# Altium footprint library PcbLib.PcbLib: 428 footprints (part 6 of 27)
Each footprint in its own frame and in the unit in brackets; x right, y up, seen from the top. Pads: shape width x height; smd on the part's side, far side on the other; paste and mask are expansions set on the pad; w line width, h text height; cw(c..) or ccw(c..) is an arc to the next point about the centre after c.
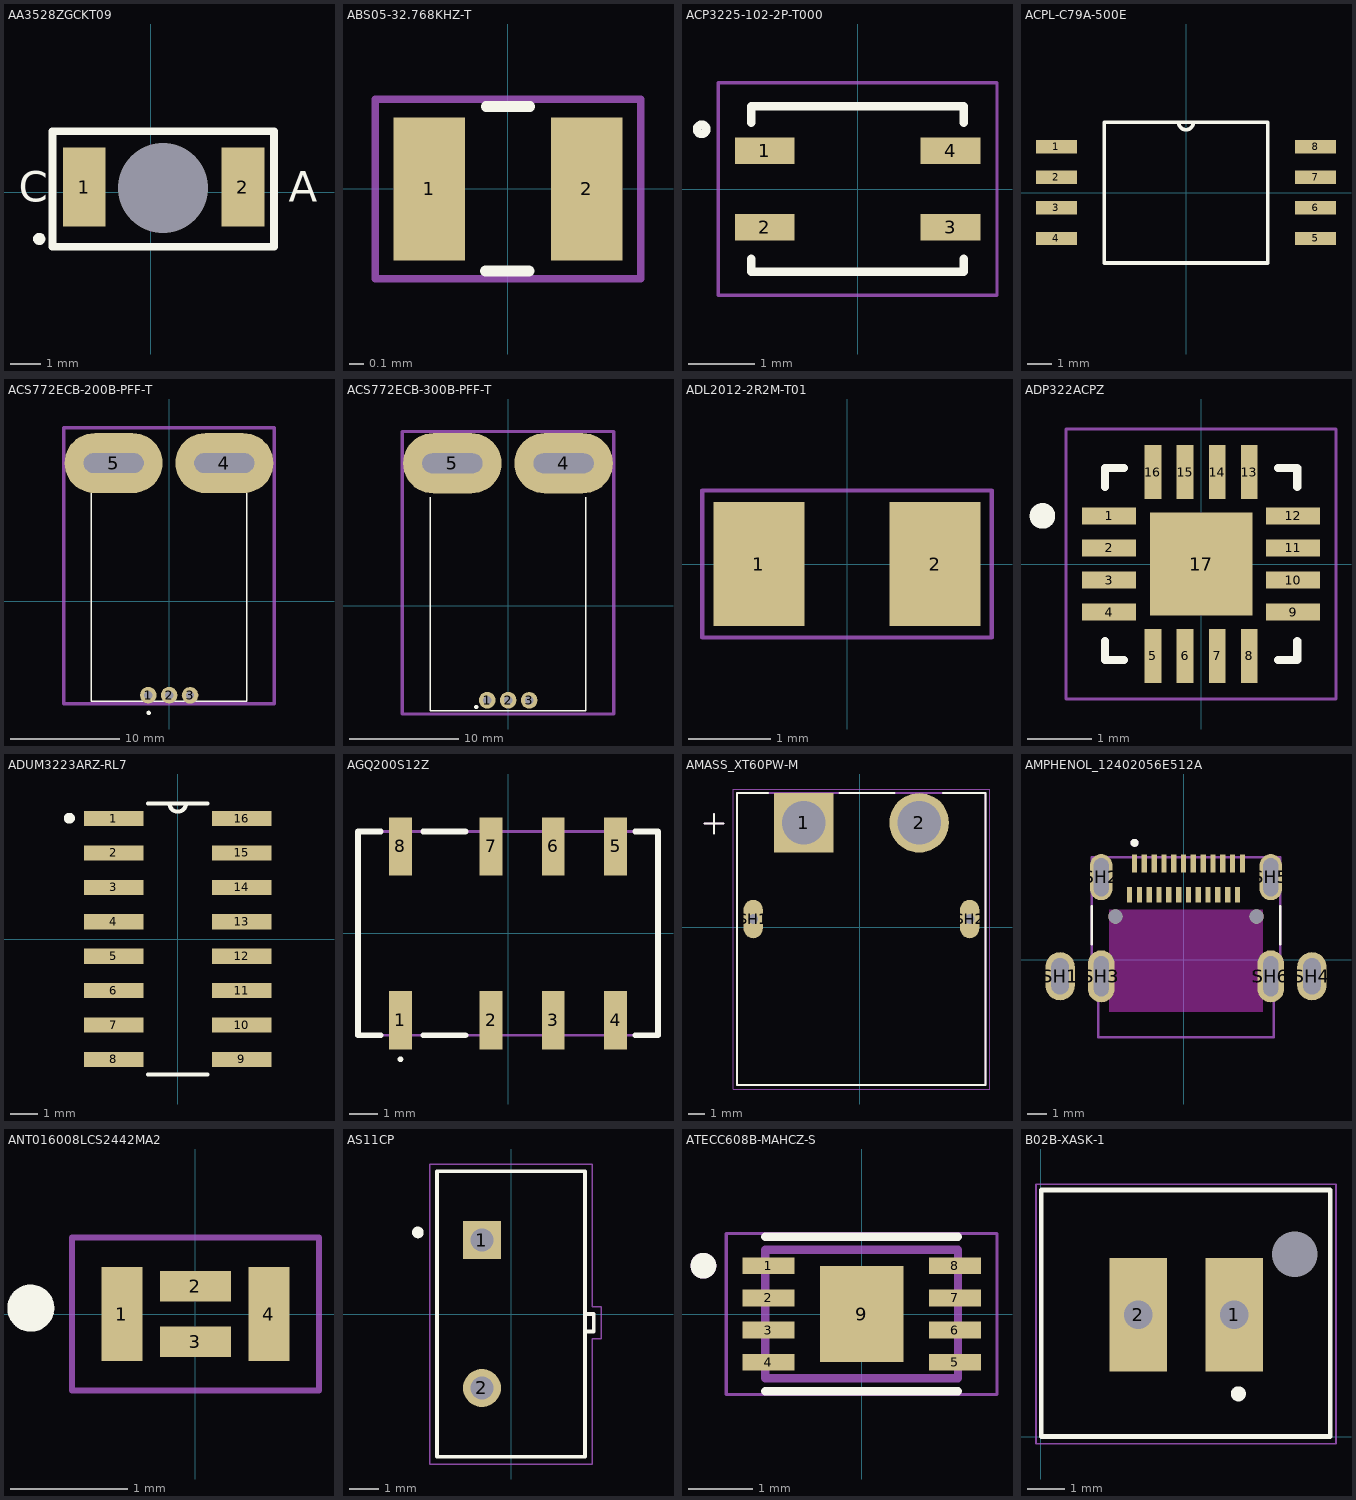
[diagram p5: the footprints below, top view; thin cyan lines are the x and y axes]

## AA3528ZGCKT09 [mil]
pads (3):
  rect 55.12x102.36 smd: 1(-86,7) 2(119,7)
  round 0 hole 116.14 unplated: 6(16,6)
Top Overlay:
  circle w7.87: c-144,-60 r3.94
  lines w10: -127,-70 159,-70 159,79 -127,79 -127,-70
  text "C" at -170.13,-12.13 h39.37
  text "A" at 177.87,-12.13 h39.37
3D body "AA3528-09.STEP": height 76.85, standoff 2.04, extent -85.72,-48.12 119,62.12
3D body: height 3.94, standoff 0, extent -35.18,-45.18 67.18,57.18

## ABS05-32.768KHZ-T [mm]
pads (2):
  rect 0.5x1 smd: 1(-0.55,0) 2(0.55,0)
Top Overlay:
  lines w0.076: -0.157,-0.574 0.147,-0.574 ; -0.152,0.577 0.152,0.577
Mechanical 15:
  lines w0.051: -0.929,-0.628 0.928,-0.628 0.928,0.627 -0.929,0.627 -0.929,-0.628
3D body "ABS05-32.768KHZ-T--3DModel-STEP-400430.STEP": height 0.5, standoff 0, extent -0.8,-0.5 0.8,0.5

## ACP3225-102-2P-T000 [mm]
pads (4):
  rect 0.9x0.4 smd: 1(-1.4,0.575) 2(-1.4,-0.575) 3(1.4,-0.575) 4(1.4,0.575)
Top Overlay:
  circle w0.127: c-2.35,0.9 r0.071
  lines w0.127: -1.6,-1.05 -1.6,-1.25 1.6,-1.25 1.6,-1.05 ; -1.6,1 -1.6,1.25 1.6,1.25 1.6,1
Mechanical 15:
  lines w0.05: -2.1,-1.6 -2.1,1.6 2.1,1.6 2.1,-1.6 -2.1,-1.6
3D body "acp3225.step": height 1.98, standoff 0.08, extent -1.6,-1.23 1.6,1.27

## ACPL-C79A-500E [mil]
pads (8):
  rect 67x22 smd: 1(-212,75) 2(-212,25) 3(-212,-25) 4(-212,-75) 5(212,-75) 6(212,-25) 7(212,25) 8(212,75)
Top Overlay:
  lines w6: -12,115 ccw(c0,115) 12,115 ; -12,115 -134,115 -134,-115 134,-115 134,115 12,115 ; -12,115 12,115
3D body "SO-8_ACPL-C79A-000E_BRA.step": height 125.12, standoff 0, extent -226.38,-115.12 226.38,114.88

## ACS772ECB-200B-PFF-T [mm]
pads (5):
  round 1.524 hole 0.762: 1(-1.9,-8.6) 2(0.01,-8.6) 3(1.932,-8.616)
  oval 9x5.5 hole 1.8 slot 5.5 at 0 deg: 4(5.08,12.7) 5(-5.08,12.7)
Top Overlay:
  circle w0.2: c-1.86,-10.23 r0.1
  lines w0.127: -7.112,9.906 -7.112,-9.144 7.112,-9.144 7.112,9.906
Mechanical 15:
  lines w0.3: -9.652,-9.398 9.652,-9.398 9.652,15.931 -9.652,15.931 -9.652,-9.398
3D body "ACS758ECB-200B-PFF-T.STEP": height 7.1, standoff -3.5, extent -7,-9.124 7,13.462

## ACS772ECB-300B-PFF-T [mm] "+- 300A"
pads (5):
  round 1.524 hole 0.762: 1(-1.9,-8.6) 2(0.01,-8.6) 3(1.932,-8.616)
  oval 9x5.5 hole 1.8 slot 5.5 at 0 deg: 4(5.08,13.02) 5(-5.08,13.02)
Top Overlay:
  circle w0.2: c-2.9,-9.22 r0.1
  lines w0.127: -7.112,9.906 -7.112,-9.57 7.112,-9.57 7.112,9.906
Mechanical 15:
  lines w0.3: -9.652,-9.86 -9.652,15.931 9.652,15.931 9.652,-9.86 -9.652,-9.86
3D body "ACS772ECB-300B-PFF-T.stp": height 7.57, standoff -2.97, extent -6.992,-8.994 7.008,13.823

## ADL2012-2R2M-T01 [mm]
pads (2):
  rect 1.1x1.5 smd: 1(-1.065,0) 2(1.065,0)
Mechanical 15:
  lines w0.05: -1.753,-0.889 1.753,-0.889 1.753,0.889 -1.753,0.889 -1.753,-0.889
3D body "IND_ADL2012_TDK.step": height 1.81, standoff 0.05, extent -1.131,-0.761 1.181,0.737

## ADP322ACPZ [mm]
pads (17):
  rect 0.84x0.26 smd: 1(-1.435,0.75) 2(-1.435,0.25) 3(-1.435,-0.25) 4(-1.435,-0.75) 9(1.435,-0.75) 10(1.435,-0.25) 11(1.435,0.25) 12(1.435,0.75)
  rect 0.26x0.84 smd: 5(-0.75,-1.435) 6(-0.25,-1.435) 7(0.25,-1.435) 8(0.75,-1.435) 13(0.75,1.435) 14(0.25,1.435) 15(-0.25,1.435) 16(-0.75,1.435)
  rect 1.6x1.6 smd paste-0.29: 17(0,0)
Top Overlay:
  circle w0.2: c-2.475,0.75 r0.1
  lines w0.127: -1.5,-1.2 -1.5,-1.5 -1.2,-1.5 ; -1.5,1.2 -1.5,1.5 -1.2,1.5 ; 1.2,-1.5 1.5,-1.5 1.5,-1.2 ; 1.2,1.5 1.5,1.5 1.5,1.2
Mechanical 15:
  lines w0.05: -2.105,-2.105 2.105,-2.105 2.105,2.105 -2.105,2.105 -2.105,-2.105
3D body "step_temp.STEP": height 0.8, standoff 0, extent -1.5,-1.5 1.5,1.5

## ADUM3223ARZ-RL7 [mil]
pads (16):
  rect 86x22 smd: 1(-93,175) 2(-93,125) 3(-93,75) 4(-93,25) 5(-93,-25) 6(-93,-75) 7(-93,-125) 8(-93,-175) 9(93,-175) 10(93,-125) 11(93,-75) 12(93,-25) 13(93,25) 14(93,75) 15(93,125) 16(93,175)
Top Overlay:
  circle w7.87: c-157.44,175.53 r3.94
  lines w6: -43,-197 43,-197 ; -43,197 -12,197 ; 43,197 12,197 ; -12,197 ccw(c0,197) 12,197 ; -12,197 12,197
3D body "ADUM3223ARZ.STEP": height 68.9, standoff 0, extent -118.11,-194.88 118.11,194.88

## AGQ200S12Z [mm]
pads (8):
  rect 0.8x2.06 smd: 1(-3.8,-3.07) 2(-0.6,-3.07) 3(1.6,-3.07) 4(3.8,-3.07) 5(3.8,3.07) 6(1.6,3.07) 7(-0.6,3.07) 8(-3.8,3.07)
Top Overlay:
  lines w0.1: -3.8,-4.5 ccw(c-3.8,-4.45) -3.8,-4.4 ccw(c-3.8,-4.45) -3.8,-4.5
  lines w0.2: -4.5,-3.6 -5.3,-3.6 -5.3,3.6 -4.5,3.6 ; -3,-3.6 -1.5,-3.6 ; -3,3.6 -1.5,3.6 ; 4.5,-3.6 5.3,-3.6 5.3,3.6 4.5,3.6
Mechanical 13:
  lines w0.1: -5.3,-3.6 -5.3,3.6 5.3,3.6 5.3,-3.6 -5.3,-3.6
3D body "AGQ200S12Z.stp": height 5.5, standoff 0, extent -5.3,-4.02 5.3,4.02

## AMASS_XT60PW-M [mm]
pads (4):
  rect 3.716x3.716 / inner round 3.716 / far side rect 3.716x3.716 hole 2.7 mask+0.102: 1(-3.498,6.508)
  round 3.716 hole 2.7 mask+0.102: 2(3.702,6.508)
  oval 1.2x2.4 hole 0.6 square mask+0.102: SH1(-6.648,0.508) SH2(6.852,0.508)
Top Overlay:
  lines w0.127: -9.698,6.458 -8.498,6.458 ; -9.098,5.858 -9.098,7.058 ; -5.726,8.358 -7.648,8.358 -7.648,-9.842 7.852,-9.842 7.852,8.358 5.18,8.358 ; -1.27,8.358 2.174,8.358
Mechanical 13:
  lines w0.127: -9.698,6.458 -8.498,6.458 ; -9.098,5.858 -9.098,7.058 ; -7.648,-9.842 7.852,-9.842 7.852,8.358 -7.648,8.358 -7.648,-9.842
Mechanical 15:
  lines w0.05: -7.898,-10.092 8.102,-10.092 8.102,8.618 -7.898,8.618 -7.898,-10.092
3D body "step_temp.STEP": height 8.4, standoff -2.55, extent -7.648,-9.842 7.852,8.358

## AMPHENOL_12402056E512A [mm]
pads (32):
  rect 0.27x0.9 smd: A1(-2.498,4.91) A2(-1.998,4.91) A3(-1.498,4.91) A4(-0.998,4.91) A5(-0.498,4.91) A6(0.002,4.91) A7(0.502,4.91) A8(1.002,4.91) A9(1.502,4.91) A10(2.002,4.91) A11(2.502,4.91) A12(3.002,4.91)
  rect 0.27x0.8 smd: B1(2.752,3.31) B2(2.252,3.31) B3(1.752,3.31) B4(1.252,3.31) B5(0.752,3.31) B6(0.252,3.31) B7(-0.248,3.31) B8(-0.748,3.31) B9(-1.248,3.31) B10(-1.748,3.31) B11(-2.248,3.31) B12(-2.748,3.31)
  oval 1.5x2.45 hole 0.9 slot 1.85 at 90 deg: SH1(-6.293,-0.84) SH4(6.547,-0.84)
  oval 1.15x2.35 hole 0.75 slot 1.95 at 90 deg: SH2(-4.193,4.21) SH5(4.447,4.21)
  oval 1.35x2.65 hole 0.75 slot 2.05 at 90 deg: SH3(-4.193,-0.84) SH6(4.447,-0.84)
  round 0.72 hole 0.72 unplated: ""(-3.473,2.21) ""(3.727,2.21)
Top Overlay:
  circle w0.2: c-2.498,5.96 r0.1
  lines w0.127: -4.668,0.798 -4.668,2.721 ; 4.922,0.798 4.922,2.721
Keep-Out Layer:
  region: 4.027,0.338 4.016,0.329 4,0.316 3.985,0.302 3.97,0.288 3.956,0.273 3.942,0.258 3.929,0.243 3.916,0.227 3.904,0.211 3.892,0.194 3.88,0.177 3.87,0.16 3.859,0.142 3.85,0.124 3.84,0.106 3.832,0.087 3.824,0.069 3.816,0.05 3.809,0.031 3.803,0.011 3.797,-0.008 3.792,-0.028 3.787,-0.048 3.783,-0.068 3.78,-0.088 3.777,-0.109 3.775,-0.129 3.773,-0.149 3.772,-0.17 3.772,-0.19 3.772,-1.49 3.772,-1.51 3.773,-1.531 3.775,-1.551 3.777,-1.571 3.78,-1.592 3.783,-1.612 3.787,-1.632 3.792,-1.652 3.797,-1.672 3.803,-1.691 3.809,-1.711 3.816,-1.73 3.824,-1.749 3.832,-1.767 3.84,-1.786 3.85,-1.804 3.859,-1.822 3.87,-1.84 3.88,-1.857 3.892,-1.874 3.904,-1.891 3.916,-1.907 3.929,-1.923 3.942,-1.938 3.956,-1.953 3.97,-1.968 3.985,-1.982 4,-1.996 4.016,-2.009 4.027,-2.018 4.027,-2.64 -3.773,-2.64 -3.773,-2.018 -3.762,-2.009 -3.746,-1.996 -3.731,-1.982 -3.716,-1.968 -3.702,-1.953 -3.688,-1.938 -3.675,-1.923 -3.662,-1.907 -3.65,-1.891 -3.638,-1.874 -3.626,-1.857 -3.616,-1.84 -3.605,-1.822 -3.596,-1.804 -3.586,-1.786 -3.578,-1.767 -3.57,-1.749 -3.562,-1.73 -3.555,-1.711 -3.549,-1.691 -3.543,-1.672 -3.538,-1.652 -3.533,-1.632 -3.529,-1.612 -3.526,-1.592 -3.523,-1.571 -3.521,-1.551 -3.519,-1.531 -3.518,-1.51 -3.518,-1.49 -3.518,-0.19 -3.518,-0.17 -3.519,-0.149 -3.521,-0.129 -3.523,-0.109 -3.526,-0.088 -3.529,-0.068 -3.533,-0.048 -3.538,-0.028 -3.543,-0.008 -3.549,0.011 -3.555,0.031 -3.562,0.05 -3.57,0.069 -3.578,0.087 -3.586,0.106 -3.596,0.124 -3.605,0.142 -3.616,0.16 -3.626,0.177 -3.638,0.194 -3.65,0.211 -3.662,0.227 -3.675,0.243 -3.688,0.258 -3.702,0.273 -3.716,0.288 -3.731,0.302 -3.746,0.316 -3.762,0.329 -3.773,0.338 -3.773,2.545 4.027,2.545
Mechanical 13:
  circle w0.2: c-2.498,5.96 r0.1
  lines w0.127: -4.668,-1.34 -4.343,-1.34 -4.343,-2.64 -4.343,-3.94 4.597,-3.94 4.597,-1.34 4.922,-1.34 4.922,5.23 -4.668,5.23 -4.668,-1.34
3D body "step_temp.STEP": height 3.44, standoff -0.88, extent -6.418,-3.94 6.672,5.18

## ANT016008LCS2442MA2 [mm]
pads (4):
  rect 0.35x0.8 smd paste-1 mask+0: 1(-0.625,0) 4(0.625,0)
  rect 0.6x0.26 smd paste-1 mask+0: 2(0,0.235) 3(0,-0.235)
Top Overlay:
  circle w0.2: c-1.4,0.05 r0.1
Top Paste:
  region: -0.45,-0.365 -0.765,-0.365 -0.765,0.365 -0.45,0.365
  region: 0.765,-0.365 0.45,-0.365 0.45,0.365 0.765,0.365
  region: 0.3,0.105 0.05,0.105 0.05,0.365 0.3,0.365
  region: -0.05,0.105 -0.3,0.105 -0.3,0.365 -0.05,0.365
  region: -0.05,-0.365 -0.3,-0.365 -0.3,-0.105 -0.05,-0.105
  region: 0.3,-0.365 0.05,-0.365 0.05,-0.105 0.3,-0.105
Top Solder:
  region: 0.765,-0.365 0.45,-0.365 0.45,0.365 0.765,0.365
  region: 0.3,0.055 -0.3,0.055 -0.3,0.365 0.3,0.365
  region: 0.3,-0.365 -0.3,-0.365 -0.3,-0.055 0.3,-0.055
  region: -0.45,-0.365 -0.765,-0.365 -0.765,0.365 -0.45,0.365
Mechanical 15:
  lines w0.05: -1.05,-0.65 1.05,-0.65 1.05,0.65 -1.05,0.65 -1.05,-0.65
3D body "QFN_2442MA2_TDK.step": height 0.41, standoff 0, extent -0.906,-0.492 0.898,0.498

## AS11CP [mm]
pads (2):
  rect 1.308x1.308 hole 0.8: 1(-1,2.54)
  round 1.308 hole 0.8: 2(-1,-2.54)
Top Overlay:
  circle w0.2: c-3.2,2.8 r0.1
  lines w0.127: 2.54,-0.6 2.84,-0.6 2.84,0 2.54,0 ; 2.54,-0.6 2.54,-4.9 -2.54,-4.9 -2.54,4.9 2.54,4.9 2.54,0 ; 2.54,-0.6 2.54,0
Mechanical 15:
  lines w0.05: -2.79,-5.15 -2.79,5.15 2.79,5.15 2.79,0.25 3.09,0.25 3.09,-0.85 2.79,-0.85 2.79,-5.15 -2.79,-5.15
3D body "AS11CP.stp": height 12.9, standoff -3.1, extent -2.54,-4.953 2.845,4.851

## ATECC608B-MAHCZ-S [mm]
pads (9):
  rect 0.81x0.26 smd: 1(-1.45,0.75) 2(-1.45,0.25) 3(-1.45,-0.25) 4(-1.45,-0.75) 5(1.45,-0.75) 6(1.45,-0.25) 7(1.45,0.25) 8(1.45,0.75)
  rect 1.3x1.5 smd paste-2: 9(0,0)
Top Overlay:
  circle w0.2: c-2.46,0.75 r0.1
  lines w0.127: -1.5,-1.2 1.5,-1.2 ; -1.5,1.2 1.5,1.2
Top Paste:
  region: 0.41,-0.47 -0.41,-0.47 -0.41,0.47 0.41,0.47
Mechanical 13:
  circle w0.2: c-2.46,0.75 r0.1
  lines w0.127: -1.5,-1 1.5,-1 1.5,1 -1.5,1 -1.5,-1
Mechanical 15:
  lines w0.05: -2.105,-1.25 2.105,-1.25 2.105,1.25 -2.105,1.25 -2.105,-1.25
3D body "ATECC608A-MAHDA-T--3DModel-STEP-56544.STEP": height 0.6, standoff 0, extent -1.5,-1.016 1.5,0.984

## B02B-XASK-1 [mm]
pads (3):
  rect 1.524x3 hole 0.75: 1(5.121,3.229) 2(2.584,3.229)
  round 0 hole 1.2: ""(6.72,4.83)
Top Overlay:
  circle w0.2: c5.23,1.14 r0.1
  lines w0.127: 0.02,0.01 0.02,6.53 7.66,6.53 7.66,0.01 0.02,0.01
Mechanical 15:
  lines w0.05: -0.12,-0.18 -0.12,6.68 7.81,6.68 7.81,-0.18 -0.12,-0.18
3D body "B02B-XASK-1.step": height 8.8, standoff -3.4, extent 0.09,0.06 7.59,6.46